# Altium footprint library myLibraryAltium.PcbLib: 215 footprints (part 5 of 14)
Each footprint in its own frame and in the unit in brackets; x right, y up, seen from the top. Pads: shape width x height; smd on the part's side, far side on the other; paste and mask are expansions set on the pad; w line width, h text height; cw(c..) or ccw(c..) is an arc to the next point about the centre after c.
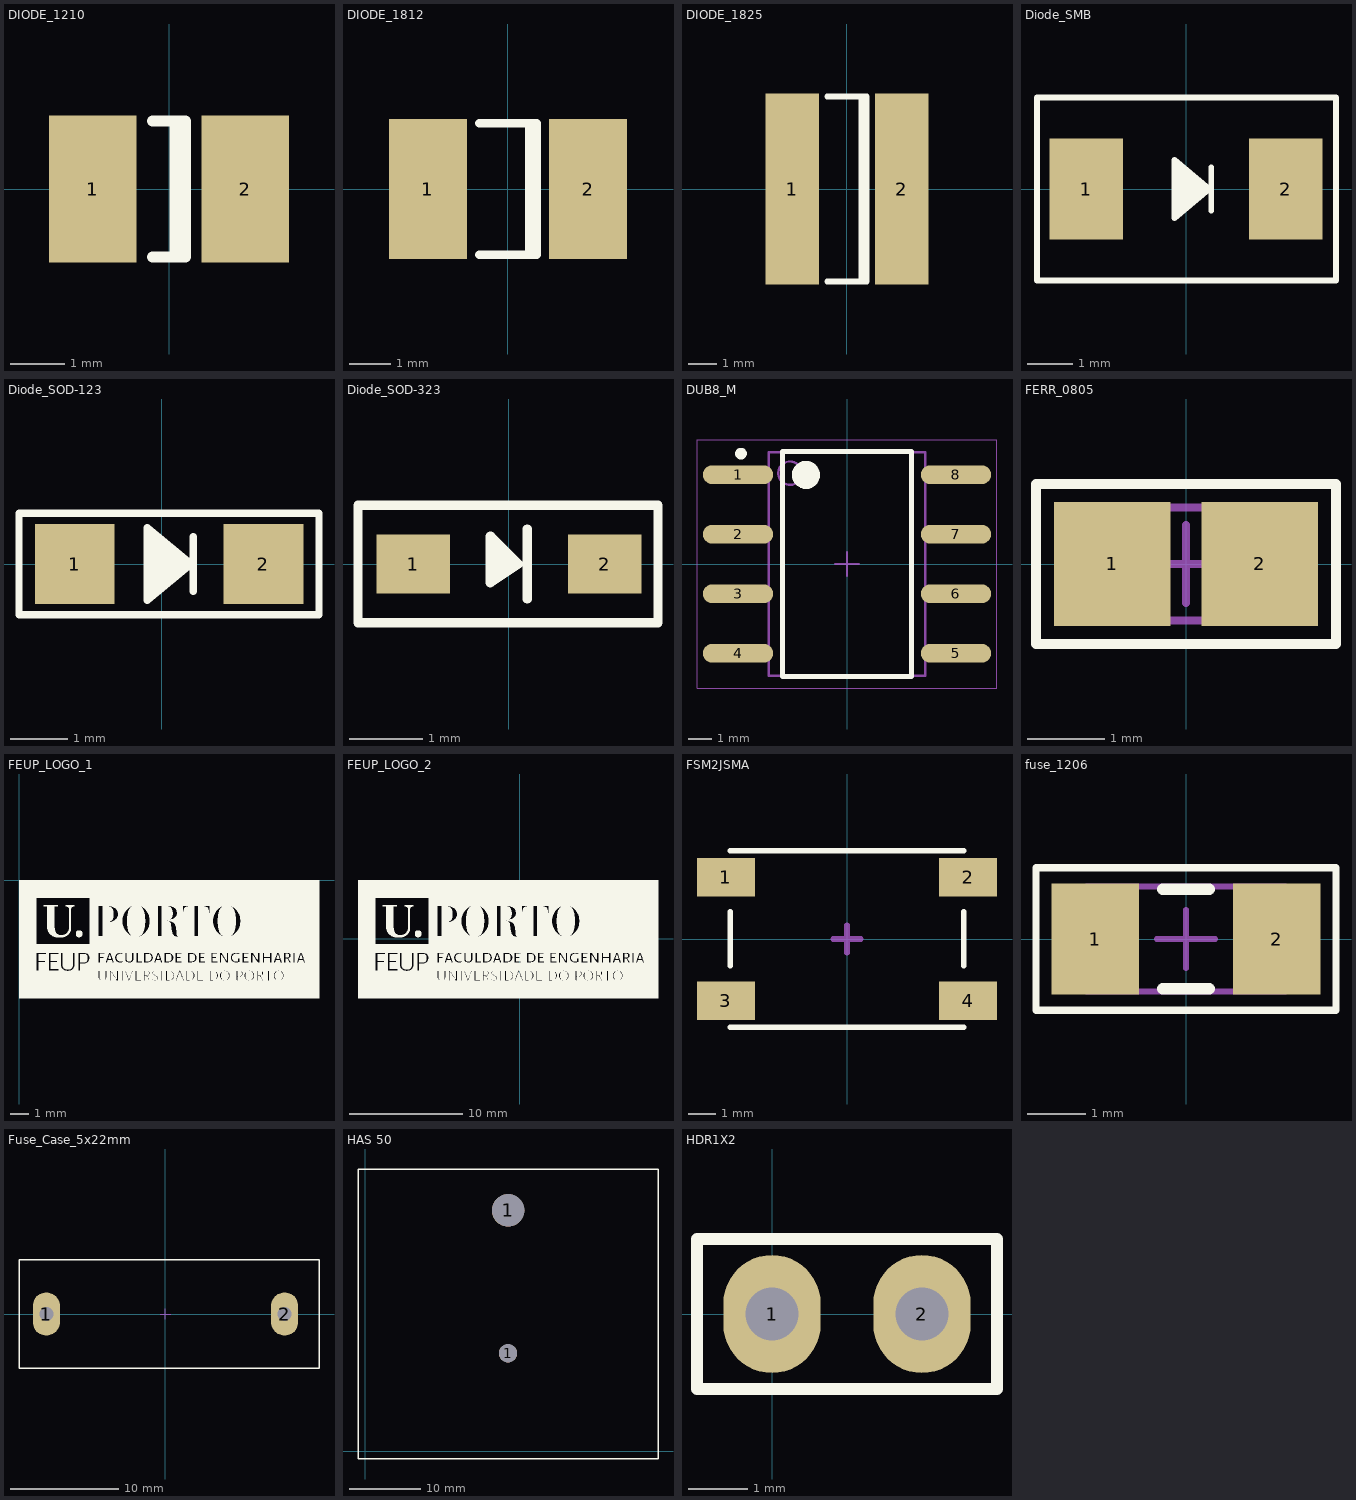
[diagram p4: the footprints below, top view; thin cyan lines are the x and y axes]

## DIODE_1210 [mm] "Chip Diode; Body 3.2 x 2.5 mm (LxW typ)"
height 1.35
pads (2):
  rect 1.6x2.7 smd: 1(-1.4,0) 2(1.4,0)
Top Overlay:
  lines w0.2: -0.3,-1.25 0.3,-1.25 0.3,1.25 -0.3,1.25 ; 0.11,-1.25 0.11,1.25

## DIODE_1812 [mm] "Chip Diode; Body 4.5 x 3.2 mm (LxW typ)"
height 1.35
pads (2):
  rect 1.9x3.4 smd: 1(-1.95,0) 2(1.95,0)
Top Overlay:
  lines w0.2: -0.7,-1.6 0.7,-1.6 0.7,1.6 -0.7,1.6 ; 0.51,-1.6 0.51,1.6

## DIODE_1825 [mm] "Chip Diode; Body 4.5 x 6.4 mm (LxW typ)"
height 1.1
pads (2):
  rect 1.9x6.8 smd: 1(-1.95,0) 2(1.95,0)
Top Overlay:
  lines w0.2: -0.7,-3.3 0.7,-3.3 0.7,3.3 -0.7,3.3 ; 0.51,-3.3 0.51,3.3

## Diode_ SMB [mm]
height 1.66

## Diode_SMB [mm]
pads (2):
  rect 1.6x2.2 smd: 1(-2.175,0) 2(2.175,0)
Top Overlay:
  lines w0.127: 0,0 0,0.127 ; 0.55,-0.475 0.55,0.475 ; -0.254,-0.508 -0.127,0.508 0.381,0 -0.254,-0.381 ; -0.254,-0.508 0.508,0 ; -0.254,-0.508 -0.254,-0.381 ; -0.254,-0.508 -0.254,-0.635 0.508,0 ; -0.254,-0.381 -0.127,0.381 0.254,0 -0.127,-0.254 -0.127,-0.127 ; -0.254,-0.381 -0.254,0.635 0.508,0 ; -0.127,-0.127 0,0.127 ; -0.127,-0.127 0.127,0 0,0.127 ; -0.127,-0.127 -0.127,0.254 0,0.127 ; -3.25,-2 3.275,-2 3.275,2 -3.25,2 -3.25,-2
3D body "User Library-DIOM5539X24.step": height 2.45, standoff 0.03, extent -2.725,-2.025 2.775,1.875

## Diode_SOD-123 [mil]
pads (2):
  rect 55x55 smd: 1(-60,0) 2(70,0)
Top Overlay:
  lines w5: 0,0 0,5 ; 21.65,-18.7 21.65,18.7 ; -10,-20 -5,20 15,0 -10,-15 ; -10,-20 20,0 ; -10,-20 -10,-15 ; -10,-20 -10,-25 20,0 ; -10,-15 -5,15 10,0 -5,-10 -5,-5 ; -10,-15 -10,25 20,0 ; -5,-5 0,5 ; -5,-5 5,0 0,5 ; -5,-5 -5,10 0,5 ; -98.43,-35 108.27,-35 108.27,35 -98.43,35 -98.43,-35
3D body "User Library-SOD123.STEP": height 50, standoff 0, extent -69.88,-31.49 75.8,31.5

## Diode_SOD-323 [mm]
pads (2):
  rect 1x0.8 smd: 1(-1.3,0) 2(1.3,0)
Top Overlay:
  lines w0.127: -0.254,-0.002 -0.254,0.379 ; -0.249,0.376 0.127,0 -0.254,-0.254 -0.254,-0.127 ; -0.127,0 -0.127,0.127 ; 0.25,-0.475 0.25,0.475 ; -0.254,-0.127 -0.127,0.127 ; -0.254,-0.127 0,0 -0.127,0.127 ; -0.254,-0.127 -0.254,0.254 -0.127,0.127 ; -2.05,-0.8 2.025,-0.8 2.025,0.8 -2.05,0.8 -2.05,-0.8
3D body "User Library-SOD323-1.step": height 1.1, standoff 0, extent -1.3,-0.675 1.3,0.675

## DUB8_M [mm] "SOP, 8-Leads, Body 9.5x6.62mm, Pitch 2.54mm, IPC Low Density"
height 4.85
pads (8):
  oval 3x0.8 smd: 1(-4.65,3.81) 2(-4.65,1.27) 3(-4.65,-1.27) 4(-4.65,-3.81) 5(4.65,-3.81) 6(4.65,-1.27) 7(4.65,1.27) 8(4.65,3.81)
Top Overlay:
  circle w0.6: c-1.75,3.8 r0.3
  circle w0.25: c-4.525,4.71 r0.125
  lines w0.2: -2.75,-4.8 2.75,-4.8 2.75,4.8 -2.75,4.8 -2.75,-4.8
Mechanical 13:
  circle w0.1: c-2.435,3.875 r0.5
  lines w0.1: -3.335,-4.775 3.335,-4.775 3.335,4.775 -3.335,4.775 -3.335,-4.775
Mechanical 15:
  lines w0.05: -6.4,-5.3 6.4,-5.3 6.4,5.3 -6.4,5.3 -6.4,-5.3
  lines w0.1: -0.5,0 0.5,0 ; 0,-0.5 0,0.5
3D body: height 4.85, standoff 0.38, extent -3.335,-4.775 3.335,4.775

## FERR_0805 [mm] "Ferrite Bead 0805"
height 1.1
pads (2):
  rect 1.5x1.6 smd: 1(-0.95,0) 2(0.95,0)
Top Overlay:
  lines w0.127: -1.929,-1.029 1.929,-1.029 1.929,1.029 -1.929,1.029 -1.929,-1.029
Mechanical 13:
  lines w0.1: -1.1,-0.725 -1.1,0.725 1.1,0.725 1.1,-0.725 -1.1,-0.725
Mechanical 15:
  lines w0.1: -0.5,0 0.5,0 ; 0,-0.5 0,0.5
3D body: height 1.1, standoff 0, extent -1.1,-0.725 1.1,0.725

## FEUP_LOGO_1 [mm] "16.5 x 6.5 mm"
Top Overlay:
  drawing of 5422 lines, arcs and shapes, not listed

## FEUP_LOGO_2 [mm] "26.5 x 10.5 mm"
Top Overlay:
  drawing of 5422 lines, arcs and shapes, not listed

## FSM2JSMA [mm] "Tactile 260G Force S"
height 4.3
pads (4):
  rect 2.1x1.4 smd: 1(-4.4,2.25) 2(4.4,2.25) 3(-4.4,-2.25) 4(4.4,-2.25)
Top Overlay:
  lines w0.2: -4.25,-3.2 4.25,-3.2 ; -4.25,3.2 4.25,3.2 ; -4.242,-0.965 -4.242,0.991 ; 4.25,-0.965 4.25,0.991
Mechanical 15:
  lines w0.2: -0.5,0 0.5,0 ; 0,-0.5 0,0.5
3D body "User Library-PTS645SL43SMTR92-LFS.STEP": height 4.3, standoff 0, extent -4.5,-2.974 4.5,3.026

## fuse_1206 [mm]
height 0.61
pads (2):
  rect 1.5x1.9 smd: 1(-1.55,0) 2(1.55,0)
Top Overlay:
  lines w0.127: -2.565,-1.215 2.565,-1.215 2.565,1.215 -2.565,1.215 -2.565,-1.215
  lines w0.2: -0.4,-0.85 0.4,-0.85 ; -0.4,0.85 0.4,0.85
Mechanical 13:
  lines w0.1: -1.7,-0.9 -1.7,0.9 1.7,0.9 1.7,-0.9 -1.7,-0.9
Mechanical 15:
  lines w0.1: -0.5,0 0.5,0 ; 0,-0.5 0,0.5
3D body: height 1.35, standoff 0, extent -1.7,-0.9 1.7,0.9

## Fuse_Case_5x22mm [mm]
height 0.61
pads (2):
  oval 2.5x4 hole 1.3: 1(-11,0) 2(11,0)
Top Overlay:
  lines w0.127: -13.525,-5 14.175,-5 14.175,5 -13.525,5 -13.525,-5
Mechanical 15:
  lines w0.1: -0.5,0 0.5,0 ; 0,-0.5 0,0.5
3D body "User Library-BLX-A Fuse Holder.step": height 13.07, standoff -4, extent -13.314,-4.825 13.864,4.775

## HAS 50 [mm] "LEM Current Transducer"
pads (2):
  round 2.55 hole 2.55 unplated: 1(20,13.75)
  round 4.55 hole 4.55 unplated: 1(20,33.75)
Top Overlay:
  lines w0.2: -1,-1 41,-1 41,39.5 -1,39.5 -1,-1
3D body "User Library-LEM_Current_Transducer_HAS50S.STEP": height 30, standoff -3, extent 0,0 40,38.5

## HDR1X2 [mm] "Connector; Header; 2 Position"
pads (2):
  oval 1.65x2 hole 0.9: 1(0,0) 2(2.54,0)
Top Overlay:
  lines w0.2: -1.27,-1.27 -1.27,1.27 3.81,1.27 3.81,-1.27 -1.27,-1.27